# Altium footprint library ISL.PcbLib: 32 footprints (part 1 of 2)
Each footprint in its own frame and in the unit in brackets; x right, y up, seen from the top. Pads: shape width x height; smd on the part's side, far side on the other; paste and mask are expansions set on the pad; w line width, h text height; cw(c..) or ccw(c..) is an arc to the next point about the centre after c.
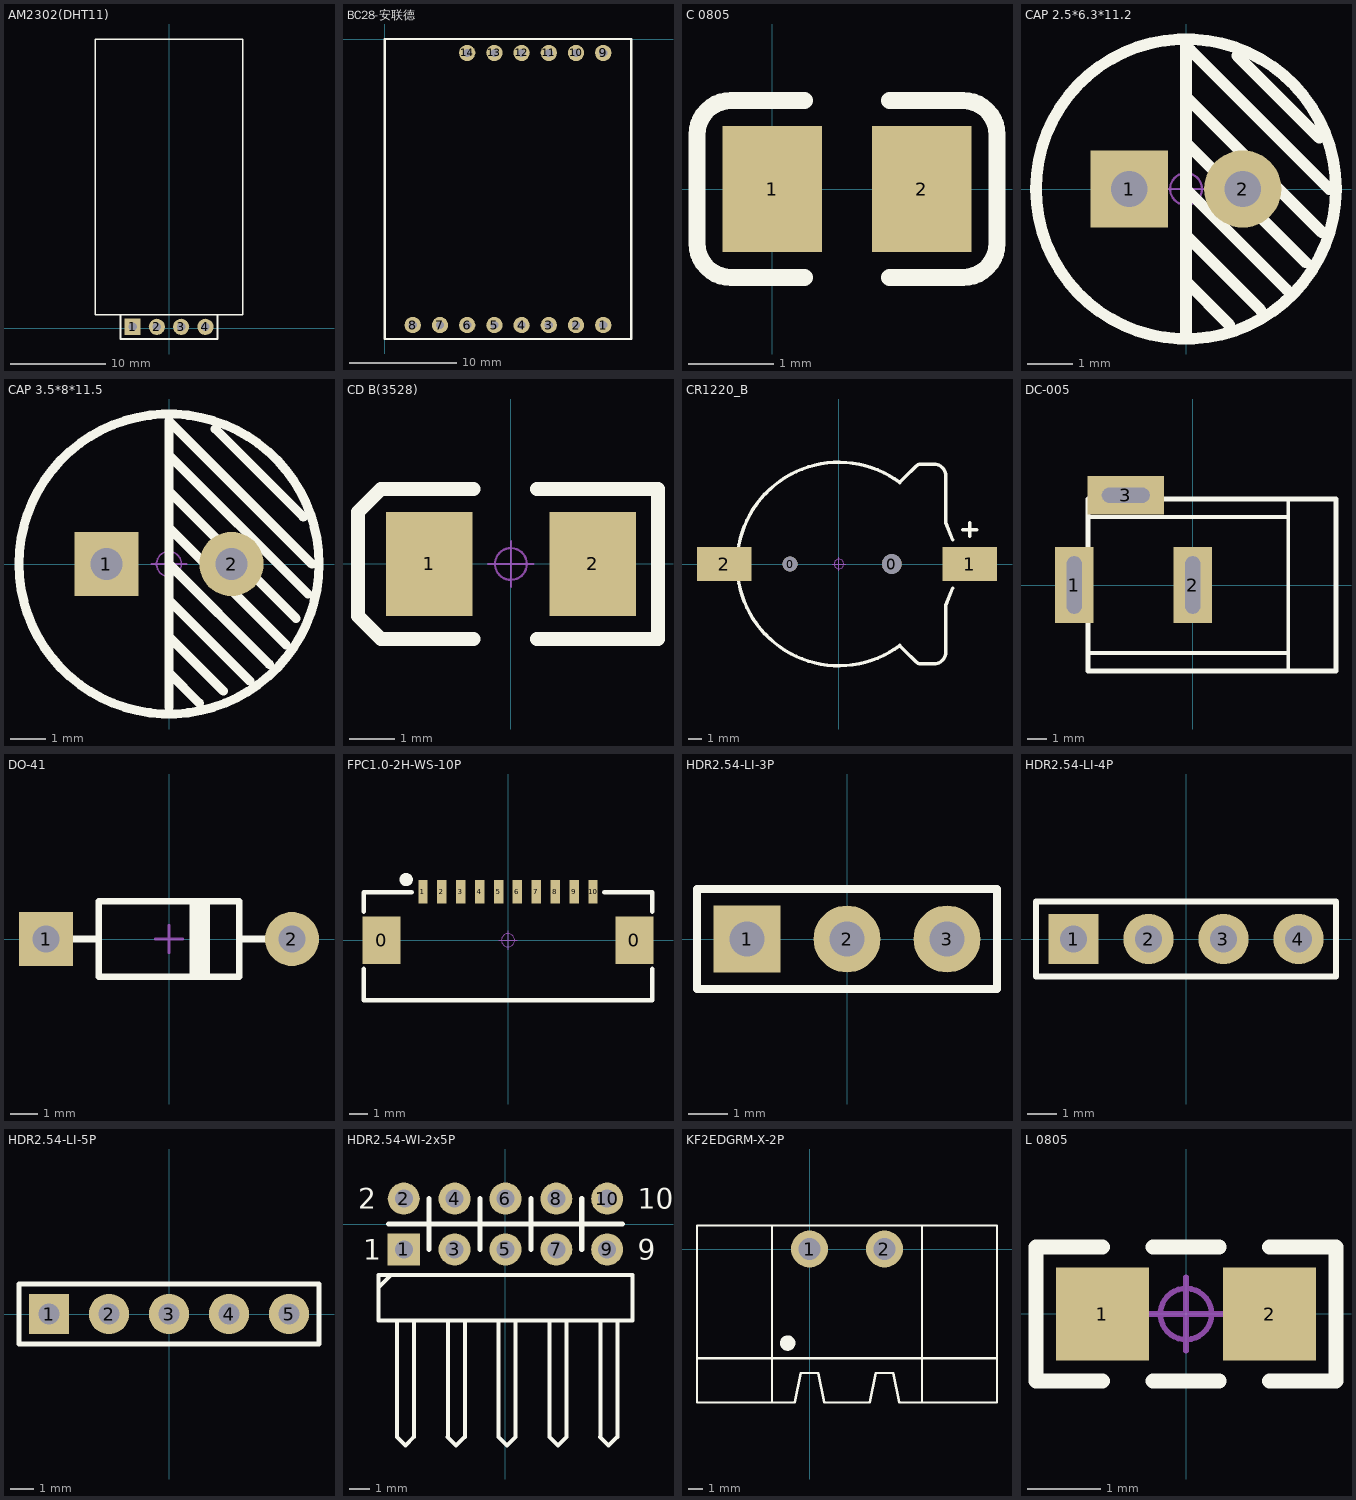
[diagram p0: the footprints below, top view; thin cyan lines are the x and y axes]

## AM2302(DHT11) [mm] "温湿度传感器"
pads (4):
  rect 1.7x1.7 hole 0.9: 1(-3.81,0.127)
  round 1.7 hole 0.9: 2(-1.27,0.127) 3(1.27,0.127) 4(3.81,0.127)
Top Overlay:
  lines w0.15: -5.08,1.397 -7.7,1.397 -7.7,30.226 7.7,30.226 7.7,1.397 5.08,1.397
  lines w0.2: -5.08,-1.143 5.08,-1.143 5.08,1.397 -5.08,1.397 -5.08,-1.143
3D body "User Library-DHT22_HOR.step": height 8.01, standoff -1.25, extent -7.607,0.063 7.493,30.163

## BC28-安联德 [mil]
pads (14):
  round 60 hole 30: 1(802.76,-1051.18) 2(702.76,-1051.18) 3(602.76,-1051.18) 4(502.76,-1051.18) 5(402.76,-1051.18) 6(302.76,-1051.18) 7(202.76,-1051.18) 8(102.76,-1051.18) 9(802.76,-51.18) 10(702.76,-51.18) 11(602.76,-51.18) 12(502.76,-51.18) 13(402.76,-51.18) 14(302.76,-51.18)
Top Overlay:
  lines w8: 0,-1102.36 905.51,-1102.36 905.51,0 0,0 0,-1102.36

## C 0805 [mm] "无极性贴片电容"
height 0.5
pads (2):
  rect 1.16x1.47 smd: 1(0,0) 2(1.75,0)
Top Overlay:
  lines w0.2: 0.375,-1.035 -0.48,-1.035 cw(c-0.48,-0.635) -0.88,-0.635 -0.88,0.635 cw(c-0.48,0.635) -0.48,1.035 0.375,1.035 ; 1.375,-1.035 2.23,-1.035 ccw(c2.23,-0.635) 2.63,-0.635 2.63,0.635 ccw(c2.23,0.635) 2.23,1.035 1.375,1.035
3D body "SW3DPS-RC0805-DEFAULT.STEP": height 0.6, standoff 0, extent -0.105,-0.615 1.895,0.635

## CAP 2.5*6.3*11.2 [mm] "脚距2.5mm直径6.3mm高度11.2mm"
pads (2):
  rect 1.7x1.7 hole 0.8: 1(-1.25,0)
  round 1.7 hole 0.8: 2(1.25,0)
Top Overlay:
  circle w0.254: c0,0 r3.3
  lines w0.254: 0,-3.15 0,3.15 ; 0,-2.032 0.953,-2.984 ; 0,-1.016 1.638,-2.654 ; 0,0 2.21,-2.21 ; 0,1.016 2.629,-1.613 ; 0,2.032 2.984,-0.953 ; 0,3.048 0.102,3.048 3.15,0 ; 1.13,2.934 2.934,1.13
Mechanical 15:
  circle w0.05: c0,0 r0.35
  lines w0.05: -0.5,0 0.5,0 ; 0,-0.5 0,0.5
3D body "CAP 2.5X6.3X11.2.STEP": height 11.23, standoff -3.38, extent -3.15,-3.15 3.16,3.15

## CAP 3.5*8*11.5 [mm] "脚距3.5mm直径8mm高度11.5mm"
pads (2):
  rect 1.8x1.8 hole 0.9: 1(-1.75,0)
  round 1.8 hole 0.9: 2(1.75,0)
Top Overlay:
  circle w0.254: c0,0 r4.2
  lines w0.254: 0,-4 0,4 4,0 ; 0,-3.048 0.851,-3.899 ; 0,-2.032 1.524,-3.556 ; 0,-1.016 2.261,-3.277 ; 0,0 2.807,-2.807 ; 0,1.016 3.277,-2.261 ; 0,2.032 3.556,-1.524 ; 0,3.048 3.886,-0.838 ; 1.295,3.785 3.759,1.321
Mechanical 15:
  circle w0.05: c0,0 r0.35
  lines w0.05: -0.5,0 0.5,0 ; 0,-0.5 0,0.5
3D body "CAP 3.5X8X11.5.STEP": height 11.53, standoff -3.38, extent -4,-4 4.01,4

## CD B(3528) [mil] "长3.5mm，宽2.8mm，厚1.9mm"
pads (2):
  rect 75x90 smd: 1(-70.87,-0.01) 2(70.86,-0.01)
Top Overlay:
  lines w12: -32.51,-65.01 -112.51,-65.01 -132.51,-45.01 -132.51,44.99 -112.51,64.99 -32.51,64.99 ; 22.49,-65.01 127.49,-65.01 127.49,64.99 22.49,64.99
Mechanical 15:
  circle w1.97: c0,0 r13.78
  lines w1.97: -19.68,0 19.68,0 ; 0,-19.68 0,19.68
3D body "CD B(3528).STEP": height 74.84, standoff -0.3, extent -68.92,-55.12 68.91,55.11

## CR1220_B [mm] "纽扣电池座"
pads (4):
  round 1.1 hole 1.1: 0(-3.6,0)
  round 1.45 hole 1.45: 0(3.9,0)
  rect 4x2.5 smd: 1(9.652,0) 2(-8.458,0)
Top Overlay:
  lines w0.254: 4.5,-6 cw(c0,0) 4.5,6 ; 4.572,-6.096 4.826,-6.35 5.662,-7.186 ccw(c6.096,-6.753) 6.096,-7.366 7.007,-7.366 ccw(c7.007,-6.499) 7.874,-6.499 7.874,-3.048 8.382,-1.778 ; 4.572,6.096 4.826,6.35 5.662,7.186 cw(c6.096,6.753) 6.096,7.366 7.007,7.366 cw(c7.007,6.499) 7.874,6.499 7.874,3.048 8.382,1.778 ; 9.144,2.54 10.16,2.54 ; 9.652,2.032 9.652,3.048
Mechanical 15:
  circle w0.05: c0,0 r0.35
  lines w0.05: -0.5,0 0.5,0 ; 0,-0.5 0,0.5
3D body "CR1220_B.STEP": height 4.05, standoff -0.85, extent -9.416,-7.45 10.34,7.45

## DC-005 [mm] "5.5*2.1mm，DC30V,2.5A"
pads (3):
  rect 2x4 hole 0.8 slot 3 at 90 deg: 1(-6.2,0) 2(0,0)
  rect 4x2 hole 0.8 slot 2.5 at 0 deg: 3(-3.5,4.7)
Top Overlay:
  lines w0.2: -5.484,-3.556 5,-3.556 ; -5.484,3.556 5,3.556 ; 5,-4.5 5,4.5
  lines w0.254: -5.484,-4.5 7.5,-4.5 7.5,4.5 -5.484,4.5 -5.484,-4.5
3D body "dc-005.STEP": height 11.2, standoff -3.8, extent -6.55,-4.5 7.5,4.8

## DO-41 [mm] "2.6*9.1mm(直径，脚距）"
height 2.4
pads (2):
  rect 2x2 hole 1: 1(-4.55,0)
  round 2 hole 1: 2(4.55,0)
Top Overlay:
  rectangle: 0.762,-1.397 1.524,1.397
  lines w0.254: -3.556,0 -2.6,0 ; 2.6,0 3.556,0 ; -2.6,-1.397 -2.6,1.397 2.6,1.397 2.6,-1.397 -2.6,-1.397
Mechanical 15:
  lines w0.1: -0.508,0 0.508,0 ; 0,-0.508 0,0.508
3D body "DO-41.STEP": height 2.65, standoff -3.45, extent -4.925,-1.288 4.975,1.314

## FPC1.0-2H-WS-10P [mm] "翻盖FPC，脚距1mm，不含脚（长14.9mm，宽5.2mm，高1.96mm）"
pads (12):
  rect 2x2.5 smd: 0(-6.69,0) 0(6.69,0)
  rect 0.5x1.25 smd: 1(-4.5,2.575) 2(-3.5,2.575) 3(-2.5,2.575) 4(-1.5,2.575) 5(-0.5,2.575) 6(0.5,2.575) 7(1.5,2.575) 8(2.5,2.575) 9(3.5,2.575) 10(4.5,2.575)
Top Overlay:
  circle w0.5: c-5.389,3.21 r0.1
  lines w0.254: -7.636,-1.524 -7.636,-3.175 7.636,-3.175 7.636,-1.524 ; -7.636,1.524 -7.636,2.54 -5.096,2.54 ; 5.096,2.54 7.636,2.54 7.636,1.524
Mechanical 15:
  circle w0.05: c0,0 r0.35
  lines w0.05: -0.5,0 0.5,0 ; 0,-0.5 0,0.5
3D body "FPC1.0 2H-WS-10P.STEP": height 2, standoff -0.02, extent -7.45,-3.15 7.45,2.85

## HDR2.54-LI-3P [mm] "排针，3脚"
pads (3):
  rect 1.7x1.7 hole 0.9: 1(-2.54,0)
  round 1.7 hole 0.9: 2(0,0) 3(2.54,0)
Top Overlay:
  lines w0.2: -3.81,-1.27 3.81,-1.27 3.81,1.27 -3.81,1.27 -3.81,-1.27
3D body "HDR2.54-1P.STEP": height 8.5, standoff -3, extent -3.81,-1.27 -1.27,1.27
3D body "HDR2.54-1P.STEP": height 8.5, standoff -3, extent -1.27,-1.27 1.27,1.27
3D body "HDR2.54-1P.STEP": height 8.5, standoff -3, extent 1.27,-1.27 3.81,1.27

## HDR2.54-LI-4P [mm] "排针，4脚"
pads (4):
  rect 1.7x1.7 hole 0.9: 1(-3.81,0)
  round 1.7 hole 0.9: 2(-1.27,0) 3(1.27,0) 4(3.81,0)
Top Overlay:
  lines w0.2: -5.08,-1.27 -5.08,1.27 5.08,1.27 5.08,-1.27 -5.08,-1.27
3D body "HDR2.54-1P.STEP": height 8.5, standoff -3, extent -5.08,-1.27 -2.54,1.27
3D body "HDR2.54-1P.STEP": height 8.5, standoff -3, extent -2.54,-1.27 0,1.27
3D body "HDR2.54-1P.STEP": height 8.5, standoff -3, extent 0,-1.27 2.54,1.27
3D body "HDR2.54-1P.STEP": height 8.5, standoff -3, extent 2.54,-1.27 5.08,1.27

## HDR2.54-LI-5P [mm] "排针，5脚"
pads (5):
  rect 1.7x1.7 hole 0.9: 1(-5.08,0)
  round 1.7 hole 0.9: 2(-2.54,0) 3(0,0) 4(2.54,0) 5(5.08,0)
Top Overlay:
  lines w0.2: -6.35,-1.27 6.35,-1.27 6.35,1.27 -6.35,1.27 -6.35,-1.27
3D body "HDR2.54-1P.STEP": height 8.5, standoff -3, extent -3.81,-1.27 -1.27,1.27
3D body "HDR2.54-1P.STEP": height 8.5, standoff -3, extent -6.35,-1.27 -3.81,1.27
3D body "HDR2.54-1P.STEP": height 8.5, standoff -3, extent 1.27,-1.27 3.81,1.27
3D body "HDR2.54-1P.STEP": height 8.5, standoff -3, extent -1.27,-1.27 1.27,1.27
3D body "HDR2.54-1P.STEP": height 8.5, standoff -3, extent 3.81,-1.27 6.35,1.27

## HDR2.54-WI-2x5P [mm] "双排弯脚排针，5x2脚"
pads (10):
  rect 1.6x1.6 hole 0.9: 1(-5.08,-1.27)
  round 1.6 hole 0.9: 2(-5.08,1.27) 3(-2.54,-1.27) 4(-2.54,1.27) 5(0,-1.27) 6(0,1.27) 7(2.54,-1.27) 8(2.54,1.27) 9(5.08,-1.27) 10(5.08,1.27)
Top Overlay:
  lines w0.2: -6.35,-3.175 -5.715,-2.54 ; -5.428,-10.634 -5.005,-11.057 -4.581,-10.634 -4.572,-10.625 -4.572,-4.826 ; -5.419,-10.634 -5.419,-4.826 ; -2.888,-10.634 -2.465,-11.057 -2.041,-10.634 ; -2.879,-10.634 -2.879,-4.826 ; -2.032,-10.634 -2.032,-4.826 ; -0.348,-10.634 0.075,-11.057 0.499,-10.634 ; -0.339,-10.634 -0.339,-4.826 ; 0.508,-10.634 0.508,-4.826 ; 2.192,-10.634 2.615,-11.057 3.039,-10.634 ; 2.201,-10.634 2.201,-4.826 ; 3.048,-10.634 3.048,-4.826 ; 4.732,-10.634 5.155,-11.057 5.579,-10.634 ; 4.741,-10.634 4.741,-4.826 ; 5.588,-10.634 5.588,-4.826 ; -6.35,-4.826 6.35,-4.826 6.35,-2.54 -6.35,-2.54 -6.35,-4.826
  lines w0.254: -5.842,0 5.842,0 ; -3.81,-1.27 -3.81,1.27 ; -1.27,-1.27 -1.27,1.27 ; 1.27,-1.27 1.27,1.27 ; 3.81,-1.27 3.81,1.27
  text "2" at -7.366,0.762 h1.02
  text "1" at -7.112,-1.778 h1.02
  text "9" at 6.604,-1.778 h1.02
  text "10" at 6.604,0.762 h1.02
Bottom Overlay:
  lines w0.254: -5.842,0 5.842,0 ; -3.81,-1.27 -3.81,1.27 ; -1.27,-1.27 -1.27,1.27 ; 1.27,-1.27 1.27,1.27 ; 3.81,-1.27 3.81,1.27
3D body "HDR-1x2_H.STEP": height 5.1, standoff -3, extent 3.81,-11.23 6.35,1.62
3D body "HDR-1x2_H.STEP": height 5.1, standoff -3, extent -1.27,-11.23 1.27,1.62
3D body "HDR-1x2_H.STEP": height 5.1, standoff -3, extent 1.27,-11.23 3.81,1.62
3D body "HDR-1x2_H.STEP": height 5.1, standoff -3, extent -6.35,-11.23 -3.81,1.62
3D body "HDR-1x2_H.STEP": height 5.1, standoff -3, extent -3.81,-11.23 -1.27,1.62

## KF2EDGRM-X-2P [mm]
pads (2):
  round 2.5 hole 1.5: 1(0,0) 2(5.08,0)
Top Overlay:
  circle w0.5: c-1.481,-6.37 r0.271
  lines w0.154: -7.62,-7.4 12.7,-7.4 ; -2.54,-10.4 -2.54,1.6 ; 7.62,1.6 7.62,-10.4 ; 7.62,-10.4 6.08,-10.4 5.68,-8.4 4.48,-8.4 4.08,-10.4 1,-10.4 0.6,-8.4 -0.6,-8.4 -1,-10.4 -7.62,-10.4 -7.62,1.6 12.7,1.6 12.7,-10.4 7.62,-10.4

## L 0805 [mm] "小功率贴片电感"
pads (2):
  rect 1.27x1.27 smd: 1(-1.143,0) 2(1.143,0)
Top Overlay:
  lines w0.203: -1.143,-0.914 -2.05,-0.914 -2.05,0.914 -1.143,0.914 ; -0.454,-0.914 0.454,-0.914 ; -0.454,0.914 0.454,0.914 ; 1.143,-0.914 2.05,-0.914 2.05,0.914 1.143,0.914
Mechanical 15:
  circle w0.076: c0,0 r0.35
  lines w0.076: -0.5,0 0.5,0 ; 0,-0.5 0,0.5
3D body "0805.STEP": height 0.9, standoff 0, extent -1,-0.6 1,0.6